# Altium footprint library DK.PcbLib: 8 footprints
Each footprint in its own frame and in the unit in brackets; x right, y up, seen from the top. Pads: shape width x height; smd on the part's side, far side on the other; paste and mask are expansions set on the pad; w line width, h text height; cw(c..) or ccw(c..) is an arc to the next point about the centre after c.
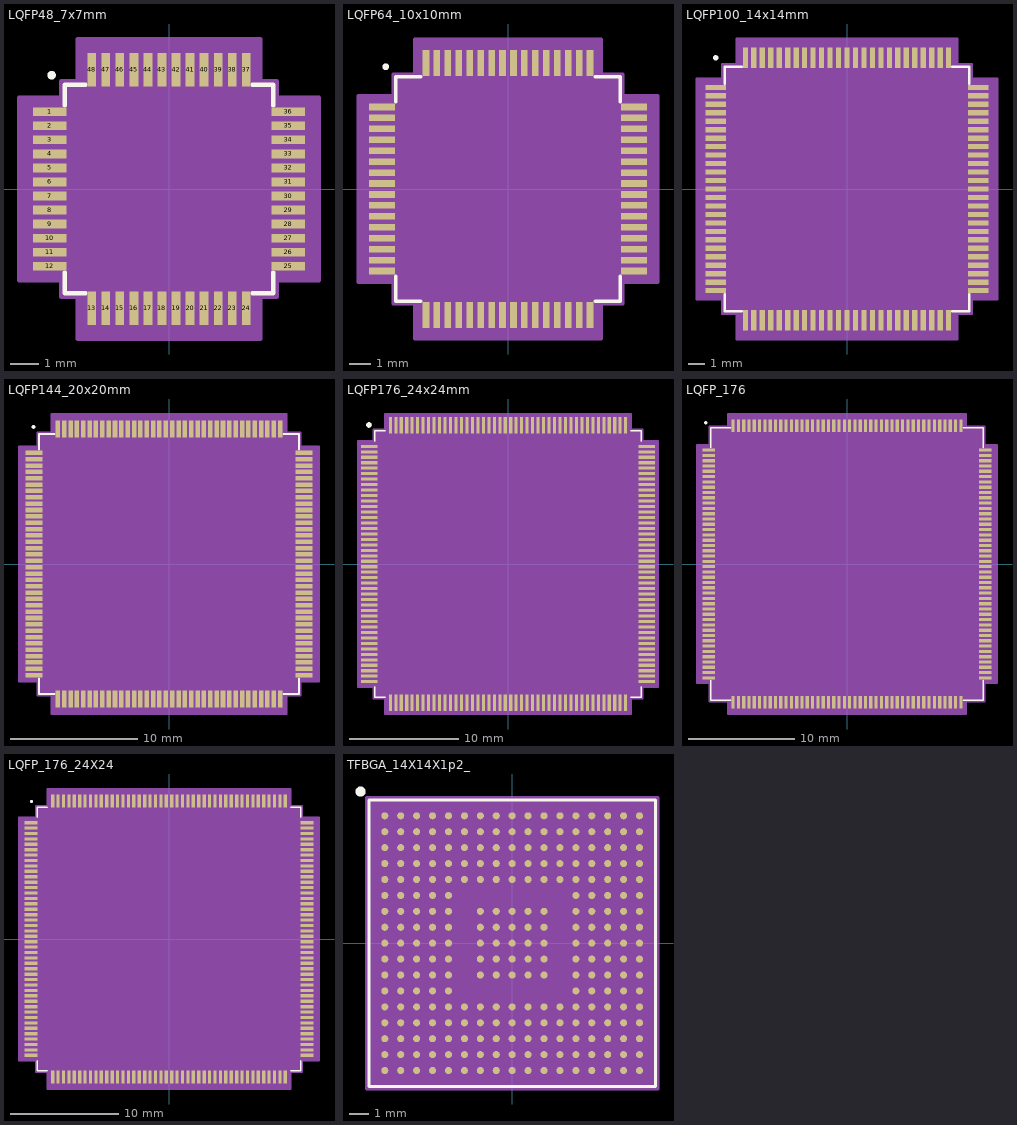
[diagram p0: the footprints below, top view; thin cyan lines are the x and y axes]

## LQFP48_7x7mm [mm]
pads (48):
  rect 1.194x0.305 smd: 1(-4.25,2.75) 2(-4.25,2.25) 3(-4.25,1.75) 4(-4.25,1.25) 5(-4.25,0.75) 6(-4.25,0.25) 7(-4.25,-0.25) 8(-4.25,-0.75) 9(-4.25,-1.25) 10(-4.25,-1.75) 11(-4.25,-2.25) 12(-4.25,-2.75) 25(4.25,-2.75) 26(4.25,-2.25) 27(4.25,-1.75) 28(4.25,-1.25) 29(4.25,-0.75) 30(4.25,-0.25) 31(4.25,0.25) 32(4.25,0.75) 33(4.25,1.25) 34(4.25,1.75) 35(4.25,2.25) 36(4.25,2.75)
  rect 0.305x1.194 smd: 13(-2.75,-4.25) 14(-2.25,-4.25) 15(-1.75,-4.25) 16(-1.25,-4.25) 17(-0.75,-4.25) 18(-0.25,-4.25) 19(0.25,-4.25) 20(0.75,-4.25) 21(1.25,-4.25) 22(1.75,-4.25) 23(2.25,-4.25) 24(2.75,-4.25) 37(2.75,4.25) 38(2.25,4.25) 39(1.75,4.25) 40(1.25,4.25) 41(0.75,4.25) 42(0.25,4.25) 43(-0.25,4.25) 44(-0.75,4.25) 45(-1.25,4.25) 46(-1.75,4.25) 47(-2.25,4.25) 48(-2.75,4.25)
Top Overlay:
  circle w0.152: c-4.191,4.064 r0.076
  lines w0.152: -3.721,-2.979 -3.721,-3.721 -2.979,-3.721 ; -3.721,2.979 -3.721,3.721 -2.979,3.721 ; 2.979,-3.721 3.721,-3.721 3.721,-2.979 ; 2.979,3.721 3.721,3.721 3.721,2.979
Mechanical 13:
  circle w0: c-3.018,2.75 r0.076
Mechanical 15:
  region: -3.258,-3.848 -3.848,-3.848 -3.848,-3.258 -5.355,-3.258 -5.355,3.258 -3.848,3.258 -3.848,3.848 -3.258,3.848 -3.258,5.355 3.258,5.355 3.258,3.848 3.848,3.848 3.848,3.258 5.355,3.258 5.355,-3.258 3.848,-3.258 3.848,-3.848 3.258,-3.848 3.258,-5.355 -3.258,-5.355
  lines w0.152: -5.355,-3.258 -5.355,3.258 -3.848,3.258 -3.848,3.848 -3.258,3.848 -3.258,5.355 3.258,5.355 3.258,3.848 3.848,3.848 3.848,3.258 5.355,3.258 5.355,-3.258 3.848,-3.258 3.848,-3.848 3.258,-3.848 3.258,-5.355 -3.258,-5.355 -3.258,-3.848 -3.848,-3.848 -3.848,-3.258 -5.355,-3.258
3D body "LQFP48_7x7mm.stp": height 1.6, standoff 0, extent -4.497,-4.497 4.497,4.497

## LQFP64_10x10mm [mm]
pads (64):
  rect 1.194x0.305 smd: 1(-5.75,3.75) 2(-5.75,3.25) 3(-5.75,2.75) 4(-5.75,2.25) 5(-5.75,1.75) 6(-5.75,1.25) 7(-5.75,0.75) 8(-5.75,0.25) 9(-5.75,-0.25) 10(-5.75,-0.75) 11(-5.75,-1.25) 12(-5.75,-1.75) 13(-5.75,-2.25) 14(-5.75,-2.75) 15(-5.75,-3.25) 16(-5.75,-3.75) 33(5.75,-3.75) 34(5.75,-3.25) 35(5.75,-2.75) 36(5.75,-2.25) 37(5.75,-1.75) 38(5.75,-1.25) 39(5.75,-0.75) 40(5.75,-0.25) 41(5.75,0.25) 42(5.75,0.75) 43(5.75,1.25) 44(5.75,1.75) 45(5.75,2.25) 46(5.75,2.75) 47(5.75,3.25) 48(5.75,3.75)
  rect 0.305x1.194 smd: 17(-3.75,-5.75) 18(-3.25,-5.75) 19(-2.75,-5.75) 20(-2.25,-5.75) 21(-1.75,-5.75) 22(-1.25,-5.75) 23(-0.75,-5.75) 24(-0.25,-5.75) 25(0.25,-5.75) 26(0.75,-5.75) 27(1.25,-5.75) 28(1.75,-5.75) 29(2.25,-5.75) 30(2.75,-5.75) 31(3.25,-5.75) 32(3.75,-5.75) 49(3.75,5.75) 50(3.25,5.75) 51(2.75,5.75) 52(2.25,5.75) 53(1.75,5.75) 54(1.25,5.75) 55(0.75,5.75) 56(0.25,5.75) 57(-0.25,5.75) 58(-0.75,5.75) 59(-1.25,5.75) 60(-1.75,5.75) 61(-2.25,5.75) 62(-2.75,5.75) 63(-3.25,5.75) 64(-3.75,5.75)
Top Overlay:
  circle w0.152: c-5.588,5.588 r0.076
  lines w0.152: -5.131,-3.975 -5.131,-5.131 -3.975,-5.131 ; -5.131,3.975 -5.131,5.131 -3.975,5.131 ; 3.975,-5.131 5.131,-5.131 5.131,-3.975 ; 3.975,5.131 5.131,5.131 5.131,3.975
Mechanical 13:
  circle w0: c-4.518,3.75 r0.076
Mechanical 15:
  region: -4.258,-5.258 -5.258,-5.258 -5.258,-4.258 -6.855,-4.258 -6.855,4.258 -5.258,4.258 -5.258,5.258 -4.258,5.258 -4.258,6.855 4.258,6.855 4.258,5.258 5.258,5.258 5.258,4.258 6.855,4.258 6.855,-4.258 5.258,-4.258 5.258,-5.258 4.258,-5.258 4.258,-6.855 -4.258,-6.855
  lines w0.152: -6.855,-4.258 -5.258,-4.258 -5.258,-5.258 -4.258,-5.258 -4.258,-6.855 4.258,-6.855 4.258,-5.258 5.258,-5.258 5.258,-4.258 6.855,-4.258 6.855,4.258 5.258,4.258 5.258,5.258 4.258,5.258 4.258,6.855 -4.258,6.855 -4.258,5.258 -5.258,5.258 -5.258,4.258 -6.855,4.258 -6.855,-4.258
3D body "LQFP64_10x10mm.stp": height 1.6, standoff 0, extent -5.997,-5.997 5.997,5.997

## LQFP100_14x14mm [mil]
pads (100):
  rect 47x12 smd: 1(-305.12,236.22) 2(-305.12,216.54) 3(-305.12,196.85) 4(-305.12,177.17) 5(-305.12,157.48) 6(-305.12,137.8) 7(-305.12,118.11) 8(-305.12,98.43) 9(-305.12,78.74) 10(-305.12,59.06) 11(-305.12,39.37) 12(-305.12,19.69) 13(-305.12,0) 14(-305.12,-19.68) 15(-305.12,-39.37) 16(-305.12,-59.06) 17(-305.12,-78.74) 18(-305.12,-98.43) 19(-305.12,-118.11) 20(-305.12,-137.8) 21(-305.12,-157.48) 22(-305.12,-177.17) 23(-305.12,-196.85) 24(-305.12,-216.54) 25(-305.12,-236.22) 51(305.12,-236.22) 52(305.12,-216.54) 53(305.12,-196.85) 54(305.12,-177.17) 55(305.12,-157.48) 56(305.12,-137.8) 57(305.12,-118.11) 58(305.12,-98.43) 59(305.12,-78.74) 60(305.12,-59.06) 61(305.12,-39.37) 62(305.12,-19.68) 63(305.12,0) 64(305.12,19.68) 65(305.12,39.37) 66(305.12,59.06) 67(305.12,78.74) 68(305.12,98.43) 69(305.12,118.11) 70(305.12,137.8) 71(305.12,157.48) 72(305.12,177.17) 73(305.12,196.85) 74(305.12,216.54) 75(305.12,236.22)
  rect 12x47 smd: 26(-236.22,-305.12) 27(-216.54,-305.12) 28(-196.85,-305.12) 29(-177.17,-305.12) 30(-157.48,-305.12) 31(-137.8,-305.12) 32(-118.11,-305.12) 33(-98.43,-305.12) 34(-78.74,-305.12) 35(-59.06,-305.12) 36(-39.37,-305.12) 37(-19.68,-305.12) 38(0,-305.12) 39(19.68,-305.12) 40(39.37,-305.12) 41(59.06,-305.12) 42(78.74,-305.12) 43(98.43,-305.12) 44(118.11,-305.12) 45(137.8,-305.12) 46(157.48,-305.12) 47(177.17,-305.12) 48(196.85,-305.12) 49(216.54,-305.12) 50(236.22,-305.12) 76(236.22,305.12) 77(216.54,305.12) 78(196.85,305.12) 79(177.17,305.12) 80(157.48,305.12) 81(137.8,305.12) 82(118.11,305.12) 83(98.43,305.12) 84(78.74,305.12) 85(59.06,305.12) 86(39.37,305.12) 87(19.68,305.12) 88(0,305.12) 89(-19.68,305.12) 90(-39.37,305.12) 91(-59.06,305.12) 92(-78.74,305.12) 93(-98.43,305.12) 94(-118.11,305.12) 95(-137.8,305.12) 96(-157.48,305.12) 97(-177.17,305.12) 98(-196.85,305.12) 99(-216.54,305.12) 100(-236.22,305.12)
Top Overlay:
  circle w6: c-305,305 r3
  lines w6: -284.5,-245.22 -284.5,-284.5 -245.22,-284.5 ; -284.5,245.22 -284.5,284.5 -245.22,284.5 ; 245.22,-284.5 284.5,-284.5 284.5,-245.22 ; 245.22,284.5 284.5,284.5 284.5,245.22
Mechanical 13:
  circle w0: c-256.62,236.22 r3
Mechanical 15:
  region: -256.22,-289.5 -289.5,-289.5 -289.5,-256.22 -348.62,-256.22 -348.62,256.22 -289.5,256.22 -289.5,289.5 -256.22,289.5 -256.22,348.62 256.22,348.62 256.22,289.5 289.5,289.5 289.5,256.22 348.62,256.22 348.62,-256.22 289.5,-256.22 289.5,-289.5 256.22,-289.5 256.22,-348.62 -256.22,-348.62
  lines w6: -348.62,-256.22 -289.5,-256.22 -289.5,-289.5 -256.22,-289.5 -256.22,-348.62 256.22,-348.62 256.22,-289.5 289.5,-289.5 289.5,-256.22 348.62,-256.22 348.62,256.22 289.5,256.22 289.5,289.5 256.22,289.5 256.22,348.62 -256.22,348.62 -256.22,289.5 -289.5,289.5 -289.5,256.22 -348.62,256.22 -348.62,-256.22
3D body "LQFP100_14x14mm.stp": height 63.1, standoff 0, extent -314.84,-314.84 314.84,314.84

## LQFP144_20x20mm [mm]
pads (144):
  rect 1.346x0.356 smd: 1(-10.625,8.75) 2(-10.625,8.25) 3(-10.625,7.75) 4(-10.625,7.25) 5(-10.625,6.75) 6(-10.625,6.25) 7(-10.625,5.75) 8(-10.625,5.25) 9(-10.625,4.75) 10(-10.625,4.25) 11(-10.625,3.75) 12(-10.625,3.25) 13(-10.625,2.75) 14(-10.625,2.25) 15(-10.625,1.75) 16(-10.625,1.25) 17(-10.625,0.75) 18(-10.625,0.25) 19(-10.625,-0.25) 20(-10.625,-0.75) 21(-10.625,-1.25) 22(-10.625,-1.75) 23(-10.625,-2.25) 24(-10.625,-2.75) 25(-10.625,-3.25) 26(-10.625,-3.75) 27(-10.625,-4.25) 28(-10.625,-4.75) 29(-10.625,-5.25) 30(-10.625,-5.75) 31(-10.625,-6.25) 32(-10.625,-6.75) 33(-10.625,-7.25) 34(-10.625,-7.75) 35(-10.625,-8.25) 36(-10.625,-8.75) 73(10.625,-8.75) 74(10.625,-8.25) 75(10.625,-7.75) 76(10.625,-7.25) 77(10.625,-6.75) 78(10.625,-6.25) 79(10.625,-5.75) 80(10.625,-5.25) 81(10.625,-4.75) 82(10.625,-4.25) 83(10.625,-3.75) 84(10.625,-3.25) 85(10.625,-2.75) 86(10.625,-2.25) 87(10.625,-1.75) 88(10.625,-1.25) 89(10.625,-0.75) 90(10.625,-0.25) 91(10.625,0.25) 92(10.625,0.75) 93(10.625,1.25) 94(10.625,1.75) 95(10.625,2.25) 96(10.625,2.75) 97(10.625,3.25) 98(10.625,3.75) 99(10.625,4.25) 100(10.625,4.75) 101(10.625,5.25) 102(10.625,5.75) 103(10.625,6.25) 104(10.625,6.75) 105(10.625,7.25) 106(10.625,7.75) 107(10.625,8.25) 108(10.625,8.75)
  rect 0.356x1.346 smd: 37(-8.75,-10.625) 38(-8.25,-10.625) 39(-7.75,-10.625) 40(-7.25,-10.625) 41(-6.75,-10.625) 42(-6.25,-10.625) 43(-5.75,-10.625) 44(-5.25,-10.625) 45(-4.75,-10.625) 46(-4.25,-10.625) 47(-3.75,-10.625) 48(-3.25,-10.625) 49(-2.75,-10.625) 50(-2.25,-10.625) 51(-1.75,-10.625) 52(-1.25,-10.625) 53(-0.75,-10.625) 54(-0.25,-10.625) 55(0.25,-10.625) 56(0.75,-10.625) 57(1.25,-10.625) 58(1.75,-10.625) 59(2.25,-10.625) 60(2.75,-10.625) 61(3.25,-10.625) 62(3.75,-10.625) 63(4.25,-10.625) 64(4.75,-10.625) 65(5.25,-10.625) 66(5.75,-10.625) 67(6.25,-10.625) 68(6.75,-10.625) 69(7.25,-10.625) 70(7.75,-10.625) 71(8.25,-10.625) 72(8.75,-10.625) 109(8.75,10.625) 110(8.25,10.625) 111(7.75,10.625) 112(7.25,10.625) 113(6.75,10.625) 114(6.25,10.625) 115(5.75,10.625) 116(5.25,10.625) 117(4.75,10.625) 118(4.25,10.625) 119(3.75,10.625) 120(3.25,10.625) 121(2.75,10.625) 122(2.25,10.625) 123(1.75,10.625) 124(1.25,10.625) 125(0.75,10.625) 126(0.25,10.625) 127(-0.25,10.625) 128(-0.75,10.625) 129(-1.25,10.625) 130(-1.75,10.625) 131(-2.25,10.625) 132(-2.75,10.625) 133(-3.25,10.625) 134(-3.75,10.625) 135(-4.25,10.625) 136(-4.75,10.625) 137(-5.25,10.625) 138(-5.75,10.625) 139(-6.25,10.625) 140(-6.75,10.625) 141(-7.25,10.625) 142(-7.75,10.625) 143(-8.25,10.625) 144(-8.75,10.625)
Top Overlay:
  circle w0.152: c-10.668,10.795 r0.076
  lines w0.152: -10.223,-9.004 -10.223,-10.223 -9.004,-10.223 ; -10.223,9.004 -10.223,10.223 -9.004,10.223 ; 9.004,-10.223 10.223,-10.223 10.223,-9.004 ; 9.004,10.223 10.223,10.223 10.223,9.004
Mechanical 13:
  circle w0: c-9.317,8.75 r0.076
Mechanical 15:
  region: -9.258,-10.351 -10.351,-10.351 -10.351,-9.258 -11.806,-9.258 -11.806,9.258 -10.351,9.258 -10.351,10.351 -9.258,10.351 -9.258,11.806 9.258,11.806 9.258,10.351 10.351,10.351 10.351,9.258 11.806,9.258 11.806,-9.258 10.351,-9.258 10.351,-10.351 9.258,-10.351 9.258,-11.806 -9.258,-11.806
  lines w0.152: -11.806,-9.258 -11.806,9.258 -10.351,9.258 -10.351,10.351 -9.258,10.351 -9.258,11.806 9.258,11.806 9.258,10.351 10.351,10.351 10.351,9.258 11.806,9.258 11.806,-9.258 10.351,-9.258 10.351,-10.351 9.258,-10.351 9.258,-11.806 -9.258,-11.806 -9.258,-10.351 -10.351,-10.351 -10.351,-9.258 -11.806,-9.258
3D body "LQFP144_20x20mm.stp": height 1.6, standoff 0, extent -10.948,-10.948 10.948,10.948

## LQFP176_24x24mm [mil]
pads (176):
  rect 58x11 smd: 1(-499,423.23) 2(-499,403.54) 3(-499,383.86) 4(-499,364.17) 5(-499,344.49) 6(-499,324.8) 7(-499,305.12) 8(-499,285.43) 9(-499,265.75) 10(-499,246.06) 11(-499,226.38) 12(-499,206.69) 13(-499,187.01) 14(-499,167.32) 15(-499,147.64) 16(-499,127.95) 17(-499,108.27) 18(-499,88.58) 19(-499,68.9) 20(-499,49.21) 21(-499,29.53) 22(-499,9.84) 23(-499,-9.84) 24(-499,-29.53) 25(-499,-49.21) 26(-499,-68.9) 27(-499,-88.58) 28(-499,-108.27) 29(-499,-127.95) 30(-499,-147.64) 31(-499,-167.32) 32(-499,-187.01) 33(-499,-206.69) 34(-499,-226.38) 35(-499,-246.06) 36(-499,-265.75) 37(-499,-285.43) 38(-499,-305.12) 39(-499,-324.8) 40(-499,-344.49) 41(-499,-364.17) 42(-499,-383.86) 43(-499,-403.54) 44(-499,-423.23) 89(499,-423.23) 90(499,-403.54) 91(499,-383.86) 92(499,-364.17) 93(499,-344.49) 94(499,-324.8) 95(499,-305.12) 96(499,-285.43) 97(499,-265.75) 98(499,-246.06) 99(499,-226.38) 100(499,-206.69) 101(499,-187.01) 102(499,-167.32) 103(499,-147.64) 104(499,-127.95) 105(499,-108.27) 106(499,-88.58) 107(499,-68.9) 108(499,-49.21) 109(499,-29.53) 110(499,-9.84) 111(499,9.84) 112(499,29.53) 113(499,49.21) 114(499,68.9) 115(499,88.58) 116(499,108.27) 117(499,127.95) 118(499,147.64) 119(499,167.32) 120(499,187.01) 121(499,206.69) 122(499,226.38) 123(499,246.06) 124(499,265.75) 125(499,285.43) 126(499,305.12) 127(499,324.8) 128(499,344.49) 129(499,364.17) 130(499,383.86) 131(499,403.54) 132(499,423.23)
  rect 11x58 smd: 45(-423.23,-499) 46(-403.54,-499) 47(-383.86,-499) 48(-364.17,-499) 49(-344.49,-499) 50(-324.8,-499) 51(-305.12,-499) 52(-285.43,-499) 53(-265.75,-499) 54(-246.06,-499) 55(-226.38,-499) 56(-206.69,-499) 57(-187.01,-499) 58(-167.32,-499) 59(-147.64,-499) 60(-127.95,-499) 61(-108.27,-499) 62(-88.58,-499) 63(-68.9,-499) 64(-49.21,-499) 65(-29.53,-499) 66(-9.84,-499) 67(9.84,-499) 68(29.53,-499) 69(49.21,-499) 70(68.9,-499) 71(88.58,-499) 72(108.27,-499) 73(127.95,-499) 74(147.64,-499) 75(167.32,-499) 76(187.01,-499) 77(206.69,-499) 78(226.38,-499) 79(246.06,-499) 80(265.75,-499) 81(285.43,-499) 82(305.12,-499) 83(324.8,-499) 84(344.49,-499) 85(364.17,-499) 86(383.86,-499) 87(403.54,-499) 88(423.23,-499) 133(423.23,499) 134(403.54,499) 135(383.86,499) 136(364.17,499) 137(344.49,499) 138(324.8,499) 139(305.12,499) 140(285.43,499) 141(265.75,499) 142(246.06,499) 143(226.38,499) 144(206.69,499) 145(187.01,499) 146(167.32,499) 147(147.64,499) 148(127.95,499) 149(108.27,499) 150(88.58,499) 151(68.9,499) 152(49.21,499) 153(29.53,499) 154(9.84,499) 155(-9.84,499) 156(-29.53,499) 157(-49.21,499) 158(-68.9,499) 159(-88.58,499) 160(-108.27,499) 161(-127.95,499) 162(-147.64,499) 163(-167.32,499) 164(-187.01,499) 165(-206.69,499) 166(-226.38,499) 167(-246.06,499) 168(-265.75,499) 169(-285.43,499) 170(-305.12,499) 171(-324.8,499) 172(-344.49,499) 173(-364.17,499) 174(-383.86,499) 175(-403.54,499) 176(-423.23,499)
Top Overlay:
  circle w10: c-500,500 r5
  lines w6: -479.5,-441.83 -479.5,-479.5 -441.83,-479.5 ; -479.5,441.83 -479.5,479.5 -441.83,479.5 ; 441.83,-479.5 479.5,-479.5 479.5,-441.83 ; 441.83,479.5 479.5,479.5 479.5,441.83
Mechanical 15:
  region: -443.23,-484.5 -484.5,-484.5 -484.5,-443.23 -539.5,-443.23 -539.5,443.23 -484.5,443.23 -484.5,484.5 -443.23,484.5 -443.23,539.5 443.23,539.5 443.23,484.5 484.5,484.5 484.5,443.23 539.5,443.23 539.5,-443.23 484.5,-443.23 484.5,-484.5 443.23,-484.5 443.23,-539.5 -443.23,-539.5
  lines w6: -539.5,-443.23 -484.5,-443.23 -484.5,-484.5 -443.23,-484.5 -443.23,-539.5 443.23,-539.5 443.23,-484.5 484.5,-484.5 484.5,-443.23 539.5,-443.23 539.5,443.23 484.5,443.23 484.5,484.5 443.23,484.5 443.23,539.5 -443.23,539.5 -443.23,484.5 -484.5,484.5 -484.5,443.23 -539.5,443.23 -539.5,-443.23
3D body "LQFP176_24x24mm.stp": height 63.1, standoff 0, extent -514,-514 514,514

## LQFP_176 [mm]
pads (176):
  rect 1.2x0.3 smd: 1(-13.05,10.75) 2(-13.05,10.25) 3(-13.05,9.75) 4(-13.05,9.25) 5(-13.05,8.75) 6(-13.05,8.25) 7(-13.05,7.75) 8(-13.05,7.25) 9(-13.05,6.75) 10(-13.05,6.25) 11(-13.05,5.75) 12(-13.05,5.25) 13(-13.05,4.75) 14(-13.05,4.25) 15(-13.05,3.75) 16(-13.05,3.25) 17(-13.05,2.75) 18(-13.05,2.25) 19(-13.05,1.75) 20(-13.05,1.25) 21(-13.05,0.75) 22(-13.05,0.25) 23(-13.05,-0.25) 24(-13.05,-0.75) 25(-13.05,-1.25) 26(-13.05,-1.75) 27(-13.05,-2.25) 28(-13.05,-2.75) 29(-13.05,-3.25) 30(-13.05,-3.75) 31(-13.05,-4.25) 32(-13.05,-4.75) 33(-13.05,-5.25) 34(-13.05,-5.75) 35(-13.05,-6.25) 36(-13.05,-6.75) 37(-13.05,-7.25) 38(-13.05,-7.75) 39(-13.05,-8.25) 40(-13.05,-8.75) 41(-13.05,-9.25) 42(-13.05,-9.75) 43(-13.05,-10.25) 44(-13.05,-10.75) 89(13.05,-10.75) 90(13.05,-10.25) 91(13.05,-9.75) 92(13.05,-9.25) 93(13.05,-8.75) 94(13.05,-8.25) 95(13.05,-7.75) 96(13.05,-7.25) 97(13.05,-6.75) 98(13.05,-6.25) 99(13.05,-5.75) 100(13.05,-5.25) 101(13.05,-4.75) 102(13.05,-4.25) 103(13.05,-3.75) 104(13.05,-3.25) 105(13.05,-2.75) 106(13.05,-2.25) 107(13.05,-1.75) 108(13.05,-1.25) 109(13.05,-0.75) 110(13.05,-0.25) 111(13.05,0.25) 112(13.05,0.75) 113(13.05,1.25) 114(13.05,1.75) 115(13.05,2.25) 116(13.05,2.75) 117(13.05,3.25) 118(13.05,3.75) 119(13.05,4.25) 120(13.05,4.75) 121(13.05,5.25) 122(13.05,5.75) 123(13.05,6.25) 124(13.05,6.75) 125(13.05,7.25) 126(13.05,7.75) 127(13.05,8.25) 128(13.05,8.75) 129(13.05,9.25) 130(13.05,9.75) 131(13.05,10.25) 132(13.05,10.75)
  rect 0.3x1.2 smd: 45(-10.75,-13.05) 46(-10.25,-13.05) 47(-9.75,-13.05) 48(-9.25,-13.05) 49(-8.75,-13.05) 50(-8.25,-13.05) 51(-7.75,-13.05) 52(-7.25,-13.05) 53(-6.75,-13.05) 54(-6.25,-13.05) 55(-5.75,-13.05) 56(-5.25,-13.05) 57(-4.75,-13.05) 58(-4.25,-13.05) 59(-3.75,-13.05) 60(-3.25,-13.05) 61(-2.75,-13.05) 62(-2.25,-13.05) 63(-1.75,-13.05) 64(-1.25,-13.05) 65(-0.75,-13.05) 66(-0.25,-13.05) 67(0.25,-13.05) 68(0.75,-13.05) 69(1.25,-13.05) 70(1.75,-13.05) 71(2.25,-13.05) 72(2.75,-13.05) 73(3.25,-13.05) 74(3.75,-13.05) 75(4.25,-13.05) 76(4.75,-13.05) 77(5.25,-13.05) 78(5.75,-13.05) 79(6.25,-13.05) 80(6.75,-13.05) 81(7.25,-13.05) 82(7.75,-13.05) 83(8.25,-13.05) 84(8.75,-13.05) 85(9.25,-13.05) 86(9.75,-13.05) 87(10.25,-13.05) 88(10.75,-13.05) 133(10.75,13.05) 134(10.25,13.05) 135(9.75,13.05) 136(9.25,13.05) 137(8.75,13.05) 138(8.25,13.05) 139(7.75,13.05) 140(7.25,13.05) 141(6.75,13.05) 142(6.25,13.05) 143(5.75,13.05) 144(5.25,13.05) 145(4.75,13.05) 146(4.25,13.05) 147(3.75,13.05) 148(3.25,13.05) 149(2.75,13.05) 150(2.25,13.05) 151(1.75,13.05) 152(1.25,13.05) 153(0.75,13.05) 154(0.25,13.05) 155(-0.25,13.05) 156(-0.75,13.05) 157(-1.25,13.05) 158(-1.75,13.05) 159(-2.25,13.05) 160(-2.75,13.05) 161(-3.25,13.05) 162(-3.75,13.05) 163(-4.25,13.05) 164(-4.75,13.05) 165(-5.25,13.05) 166(-5.75,13.05) 167(-6.25,13.05) 168(-6.75,13.05) 169(-7.25,13.05) 170(-7.75,13.05) 171(-8.25,13.05) 172(-8.75,13.05) 173(-9.25,13.05) 174(-9.75,13.05) 175(-10.25,13.05) 176(-10.75,13.05)
Top Overlay:
  circle w0.152: c-13.335,13.335 r0.076
  lines w0.152: -12.877,-10.976 -12.877,-12.877 -10.976,-12.877 ; -12.877,10.976 -12.877,12.877 -10.976,12.877 ; 10.976,-12.877 12.877,-12.877 12.877,-10.976 ; 10.976,12.877 12.877,12.877 12.877,10.976
Mechanical 13:
  circle w0: c-11.815,10.75 r0.076
Mechanical 15:
  region: -11.258,-13.004 -13.004,-13.004 -13.004,-11.258 -14.158,-11.258 -14.158,11.258 -13.004,11.258 -13.004,13.004 -11.258,13.004 -11.258,14.158 11.258,14.158 11.258,13.004 13.004,13.004 13.004,11.258 14.158,11.258 14.158,-11.258 13.004,-11.258 13.004,-13.004 11.258,-13.004 11.258,-14.158 -11.258,-14.158
  lines w0.152: -14.158,-11.258 -13.004,-11.258 -13.004,-13.004 -11.258,-13.004 -11.258,-14.158 11.258,-14.158 11.258,-13.004 13.004,-13.004 13.004,-11.258 14.158,-11.258 14.158,11.258 13.004,11.258 13.004,13.004 11.258,13.004 11.258,14.158 -11.258,14.158 -11.258,13.004 -13.004,13.004 -13.004,11.258 -14.158,11.258 -14.158,-11.258
3D body "LQFP_176.stp": height 1.65, standoff 0, extent -13.3,-13.3 13.3,13.3

## LQFP_176_24X24 [mm]
pads (176):
  rect 1.2x0.3 smd: 1(-12.75,10.75) 2(-12.75,10.25) 3(-12.75,9.75) 4(-12.75,9.25) 5(-12.75,8.75) 6(-12.75,8.25) 7(-12.75,7.75) 8(-12.75,7.25) 9(-12.75,6.75) 10(-12.75,6.25) 11(-12.75,5.75) 12(-12.75,5.25) 13(-12.75,4.75) 14(-12.75,4.25) 15(-12.75,3.75) 16(-12.75,3.25) 17(-12.75,2.75) 18(-12.75,2.25) 19(-12.75,1.75) 20(-12.75,1.25) 21(-12.75,0.75) 22(-12.75,0.25) 23(-12.75,-0.25) 24(-12.75,-0.75) 25(-12.75,-1.25) 26(-12.75,-1.75) 27(-12.75,-2.25) 28(-12.75,-2.75) 29(-12.75,-3.25) 30(-12.75,-3.75) 31(-12.75,-4.25) 32(-12.75,-4.75) 33(-12.75,-5.25) 34(-12.75,-5.75) 35(-12.75,-6.25) 36(-12.75,-6.75) 37(-12.75,-7.25) 38(-12.75,-7.75) 39(-12.75,-8.25) 40(-12.75,-8.75) 41(-12.75,-9.25) 42(-12.75,-9.75) 43(-12.75,-10.25) 44(-12.75,-10.75) 89(12.75,-10.75) 90(12.75,-10.25) 91(12.75,-9.75) 92(12.75,-9.25) 93(12.75,-8.75) 94(12.75,-8.25) 95(12.75,-7.75) 96(12.75,-7.25) 97(12.75,-6.75) 98(12.75,-6.25) 99(12.75,-5.75) 100(12.75,-5.25) 101(12.75,-4.75) 102(12.75,-4.25) 103(12.75,-3.75) 104(12.75,-3.25) 105(12.75,-2.75) 106(12.75,-2.25) 107(12.75,-1.75) 108(12.75,-1.25) 109(12.75,-0.75) 110(12.75,-0.25) 111(12.75,0.25) 112(12.75,0.75) 113(12.75,1.25) 114(12.75,1.75) 115(12.75,2.25) 116(12.75,2.75) 117(12.75,3.25) 118(12.75,3.75) 119(12.75,4.25) 120(12.75,4.75) 121(12.75,5.25) 122(12.75,5.75) 123(12.75,6.25) 124(12.75,6.75) 125(12.75,7.25) 126(12.75,7.75) 127(12.75,8.25) 128(12.75,8.75) 129(12.75,9.25) 130(12.75,9.75) 131(12.75,10.25) 132(12.75,10.75)
  rect 0.3x1.2 smd: 45(-10.75,-12.75) 46(-10.25,-12.75) 47(-9.75,-12.75) 48(-9.25,-12.75) 49(-8.75,-12.75) 50(-8.25,-12.75) 51(-7.75,-12.75) 52(-7.25,-12.75) 53(-6.75,-12.75) 54(-6.25,-12.75) 55(-5.75,-12.75) 56(-5.25,-12.75) 57(-4.75,-12.75) 58(-4.25,-12.75) 59(-3.75,-12.75) 60(-3.25,-12.75) 61(-2.75,-12.75) 62(-2.25,-12.75) 63(-1.75,-12.75) 64(-1.25,-12.75) 65(-0.75,-12.75) 66(-0.25,-12.75) 67(0.25,-12.75) 68(0.75,-12.75) 69(1.25,-12.75) 70(1.75,-12.75) 71(2.25,-12.75) 72(2.75,-12.75) 73(3.25,-12.75) 74(3.75,-12.75) 75(4.25,-12.75) 76(4.75,-12.75) 77(5.25,-12.75) 78(5.75,-12.75) 79(6.25,-12.75) 80(6.75,-12.75) 81(7.25,-12.75) 82(7.75,-12.75) 83(8.25,-12.75) 84(8.75,-12.75) 85(9.25,-12.75) 86(9.75,-12.75) 87(10.25,-12.75) 88(10.75,-12.75) 133(10.75,12.75) 134(10.25,12.75) 135(9.75,12.75) 136(9.25,12.75) 137(8.75,12.75) 138(8.25,12.75) 139(7.75,12.75) 140(7.25,12.75) 141(6.75,12.75) 142(6.25,12.75) 143(5.75,12.75) 144(5.25,12.75) 145(4.75,12.75) 146(4.25,12.75) 147(3.75,12.75) 148(3.25,12.75) 149(2.75,12.75) 150(2.25,12.75) 151(1.75,12.75) 152(1.25,12.75) 153(0.75,12.75) 154(0.25,12.75) 155(-0.25,12.75) 156(-0.75,12.75) 157(-1.25,12.75) 158(-1.75,12.75) 159(-2.25,12.75) 160(-2.75,12.75) 161(-3.25,12.75) 162(-3.75,12.75) 163(-4.25,12.75) 164(-4.75,12.75) 165(-5.25,12.75) 166(-5.75,12.75) 167(-6.25,12.75) 168(-6.75,12.75) 169(-7.25,12.75) 170(-7.75,12.75) 171(-8.25,12.75) 172(-8.75,12.75) 173(-9.25,12.75) 174(-9.75,12.75) 175(-10.25,12.75) 176(-10.75,12.75)
Top Overlay:
  circle w0.152: c-12.7,12.7 r0.076
  lines w0.152: -12.177,-11.233 -12.177,-12.177 -11.233,-12.177 ; -12.177,11.233 -12.177,12.177 -11.233,12.177 ; 11.233,-12.177 12.177,-12.177 12.177,-11.233 ; 11.233,12.177 12.177,12.177 12.177,11.233
Mechanical 13:
  circle w0: c-11.515,10.75 r0.076
Mechanical 15:
  region: -11.258,-12.304 -12.304,-12.304 -12.304,-11.258 -13.858,-11.258 -13.858,11.258 -12.304,11.258 -12.304,12.304 -11.258,12.304 -11.258,13.858 11.258,13.858 11.258,12.304 12.304,12.304 12.304,11.258 13.858,11.258 13.858,-11.258 12.304,-11.258 12.304,-12.304 11.258,-12.304 11.258,-13.858 -11.258,-13.858
  lines w0.152: -13.858,-11.258 -13.858,11.258 -12.304,11.258 -12.304,12.304 -11.258,12.304 -11.258,13.858 11.258,13.858 11.258,12.304 12.304,12.304 12.304,11.258 13.858,11.258 13.858,-11.258 12.304,-11.258 12.304,-12.304 11.258,-12.304 11.258,-13.858 -11.258,-13.858 -11.258,-12.304 -12.304,-12.304 -12.304,-11.258 -13.858,-11.258
3D body "LQFP_176_24X24.stp": height 1.6, standoff 0, extent -13,-13 13,13

## TFBGA_14X14X1p2_ [mil]
pads (265):
  round 14 smd: A1(-251.97,251.97) A2(-220.47,251.97) A3(-188.98,251.97) A4(-157.48,251.97) A5(-125.98,251.97) A6(-94.49,251.97) A7(-62.99,251.97) A8(-31.5,251.97) A9(0,251.97) A10(31.5,251.97) A11(62.99,251.97) A12(94.49,251.97) A13(125.98,251.97) A14(157.48,251.97) A15(188.98,251.97) A16(220.47,251.97) A17(251.97,251.97) B1(-251.97,220.47) B2(-220.47,220.47) B3(-188.98,220.47) B4(-157.48,220.47) B5(-125.98,220.47) B6(-94.49,220.47) B7(-62.99,220.47) B8(-31.5,220.47) B9(0,220.47) B10(31.5,220.47) B11(62.99,220.47) B12(94.49,220.47) B13(125.98,220.47) B14(157.48,220.47) B15(188.98,220.47) B16(220.47,220.47) B17(251.97,220.47) C1(-251.97,188.98) C2(-220.47,188.98) C3(-188.98,188.98) C4(-157.48,188.98) C5(-125.98,188.98) C6(-94.49,188.98) C7(-62.99,188.98) C8(-31.5,188.98) C9(0,188.98) C10(31.5,188.98) C11(62.99,188.98) C12(94.49,188.98) C13(125.98,188.98) C14(157.48,188.98) C15(188.98,188.98) C16(220.47,188.98) C17(251.97,188.98) D1(-251.97,157.48) D2(-220.47,157.48) D3(-188.98,157.48) D4(-157.48,157.48) D5(-125.98,157.48) D6(-94.49,157.48) D7(-62.99,157.48) D8(-31.5,157.48) D9(0,157.48) D10(31.5,157.48) D11(62.99,157.48) D12(94.49,157.48) D13(125.98,157.48) D14(157.48,157.48) D15(188.98,157.48) D16(220.47,157.48) D17(251.97,157.48) E1(-251.97,125.98) E2(-220.47,125.98) E3(-188.98,125.98) E4(-157.48,125.98) E5(-125.98,125.98) E6(-94.49,125.98) E7(-62.99,125.98) E8(-31.5,125.98) E9(0,125.98) E10(31.5,125.98) E11(62.99,125.98) E12(94.49,125.98) E13(125.98,125.98) E14(157.48,125.98) E15(188.98,125.98) E16(220.47,125.98) E17(251.97,125.98) F1(-251.97,94.49) F2(-220.47,94.49) F3(-188.98,94.49) F4(-157.48,94.49) F5(-125.98,94.49) F13(125.98,94.49) F14(157.48,94.49) F15(188.98,94.49) F16(220.47,94.49) F17(251.97,94.49) G1(-251.97,62.99) G2(-220.47,62.99) G3(-188.98,62.99) G4(-157.48,62.99) G5(-125.98,62.99) G7(-62.99,62.99) G8(-31.5,62.99) G9(0,62.99) G10(31.5,62.99) G11(62.99,62.99) G13(125.98,62.99) G14(157.48,62.99) G15(188.98,62.99) G16(220.47,62.99) G17(251.97,62.99) H1(-251.97,31.5) H2(-220.47,31.5) H3(-188.98,31.5) H4(-157.48,31.5) H5(-125.98,31.5) H7(-62.99,31.5) H8(-31.5,31.5) H9(0,31.5) H10(31.5,31.5) H11(62.99,31.5) H13(125.98,31.5) H14(157.48,31.5) H15(188.98,31.5) H16(220.47,31.5) H17(251.97,31.5) J1(-251.97,0) J2(-220.47,0) J3(-188.98,0) J4(-157.48,0) J5(-125.98,0) J7(-62.99,0) J8(-31.5,0) J9(0,0) J10(31.5,0) J11(62.99,0) J13(125.98,0) J14(157.48,0) J15(188.98,0) J16(220.47,0) J17(251.97,0) K1(-251.97,-31.5) K2(-220.47,-31.5) K3(-188.98,-31.5) K4(-157.48,-31.5) K5(-125.98,-31.5) K7(-62.99,-31.5) K8(-31.5,-31.5) K9(0,-31.5) K10(31.5,-31.5) K11(62.99,-31.5) K13(125.98,-31.5) K14(157.48,-31.5) K15(188.98,-31.5) K16(220.47,-31.5) K17(251.97,-31.5) L1(-251.97,-62.99) L2(-220.47,-62.99) L3(-188.98,-62.99) L4(-157.48,-62.99) L5(-125.98,-62.99) L7(-62.99,-62.99) L8(-31.5,-62.99) L9(0,-62.99) L10(31.5,-62.99) L11(62.99,-62.99) L13(125.98,-62.99) L14(157.48,-62.99) L15(188.98,-62.99) L16(220.47,-62.99) L17(251.97,-62.99) M1(-251.97,-94.49) M2(-220.47,-94.49) M3(-188.98,-94.49) M4(-157.48,-94.49) M5(-125.98,-94.49) M13(125.98,-94.49) M14(157.48,-94.49) M15(188.98,-94.49) M16(220.47,-94.49) M17(251.97,-94.49) N1(-251.97,-125.98) N2(-220.47,-125.98) N3(-188.98,-125.98) N4(-157.48,-125.98) N5(-125.98,-125.98) N6(-94.49,-125.98) N7(-62.99,-125.98) N8(-31.5,-125.98) N9(0,-125.98) N10(31.5,-125.98) N11(62.99,-125.98) N12(94.49,-125.98) N13(125.98,-125.98) N14(157.48,-125.98) N15(188.98,-125.98) N16(220.47,-125.98) N17(251.97,-125.98) P1(-251.97,-157.48) P2(-220.47,-157.48) P3(-188.98,-157.48) P4(-157.48,-157.48) P5(-125.98,-157.48) P6(-94.49,-157.48) P7(-62.99,-157.48) P8(-31.5,-157.48) P9(0,-157.48) P10(31.5,-157.48) P11(62.99,-157.48) P12(94.49,-157.48) P13(125.98,-157.48) P14(157.48,-157.48) P15(188.98,-157.48) P16(220.47,-157.48) P17(251.97,-157.48) R1(-251.97,-188.98) R2(-220.47,-188.98) R3(-188.98,-188.98) R4(-157.48,-188.98) R5(-125.98,-188.98) R6(-94.49,-188.98) R7(-62.99,-188.98) R8(-31.5,-188.98) R9(0,-188.98) R10(31.5,-188.98) R11(62.99,-188.98) R12(94.49,-188.98) R13(125.98,-188.98) R14(157.48,-188.98) R15(188.98,-188.98) R16(220.47,-188.98) R17(251.97,-188.98) T1(-251.97,-220.47) T2(-220.47,-220.47) T3(-188.98,-220.47) T4(-157.48,-220.47) T5(-125.98,-220.47) T6(-94.49,-220.47) T7(-62.99,-220.47) T8(-31.5,-220.47) T9(0,-220.47) T10(31.5,-220.47) T11(62.99,-220.47) T12(94.49,-220.47) T13(125.98,-220.47) T14(157.48,-220.47) T15(188.98,-220.47) T16(220.47,-220.47) T17(251.97,-220.47) U1(-251.97,-251.97) U2(-220.47,-251.97) U3(-188.98,-251.97) U4(-157.48,-251.97) U5(-125.98,-251.97) U6(-94.49,-251.97) U7(-62.99,-251.97) U8(-31.5,-251.97) U9(0,-251.97) U10(31.5,-251.97) U11(62.99,-251.97) U12(94.49,-251.97) U13(125.98,-251.97) U14(157.48,-251.97) U15(188.98,-251.97) U16(220.47,-251.97) U17(251.97,-251.97)
Top Overlay:
  circle w10: c-300,300 r5
  lines w6: -283.5,-283.5 283.5,-283.5 283.5,283.5 -283.5,283.5 -283.5,-283.5
Mechanical 15:
  region: 288.5,-288.5 -288.5,-288.5 -288.5,288.5 288.5,288.5
  lines w6: -288.5,-288.5 -288.5,288.5 288.5,288.5 288.5,-288.5 -288.5,-288.5
3D body "TFBGA_14X14X1p2_.stp": height 43.1, standoff 0, extent -278.5,-278.5 278.5,278.5